# Altium footprint library Amirreza.PcbLib: 524 footprints (part 18 of 33)
Each footprint in its own frame and in the unit in brackets; x right, y up, seen from the top. Pads: shape width x height; smd on the part's side, far side on the other; paste and mask are expansions set on the pad; w line width, h text height; cw(c..) or ccw(c..) is an arc to the next point about the centre after c.
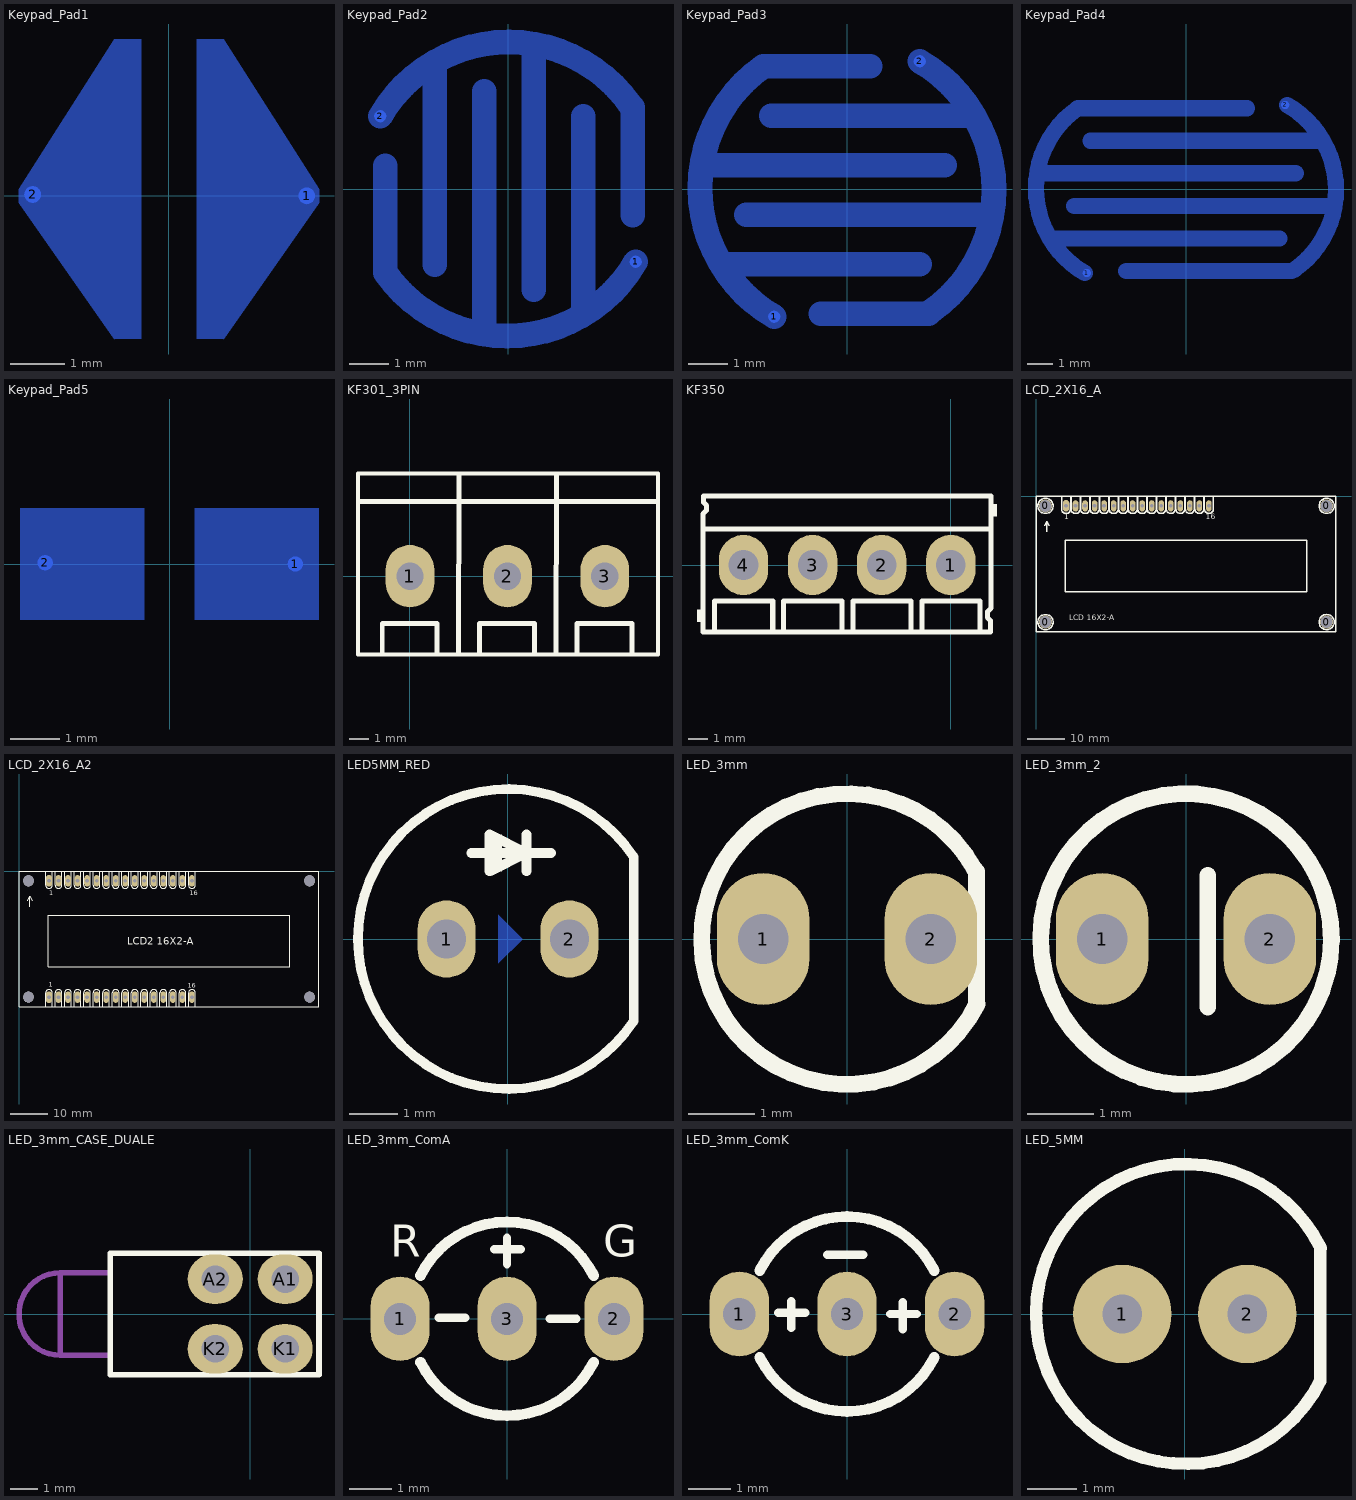
[diagram p17: the footprints below, top view; thin cyan lines are the x and y axes]

## Keypad_Pad1 [mm]
pads (2):
  round 0.3 smd far side: 1(2.525,0) 2(-2.5,0.025)
Bottom Layer:
  rectangle: -1,-2.625 -0.5,2.875
  rectangle: 0.5,-2.625 1,2.875
  region: 1,2.875 2.75,0.125 2.75,-0.125 1,-2.625
  region: -1,2.875 -2.75,0.125 -2.75,-0.125 -1,-2.625
Bottom Solder:
  rectangle: 0.5,-2.625 1,2.875
  rectangle: -1,-2.625 -0.5,2.875
  region: 1,2.875 2.75,0.125 2.75,-0.125 1,-2.625
  region: -1,2.875 -2.75,0.125 -2.75,-0.125 -1,-2.625

## Keypad_Pad2 [mm]
pads (2):
  round 0.3 smd far side: 1(3.263,-1.867) 2(-3.289,1.867)
Bottom Layer:
  lines w0.254: -0.739,-3.773 -0.624,-3.721 -0.739,-3.773
  lines w0.635: -3.289,1.867 cw(c0.011,-0.038) 3.132,2.148 ; -3.164,-2.146 -3.164,0.597 ; -3.157,-2.148 ccw(c-0.036,0.038) 3.263,-1.867 ; -1.894,-1.943 -1.894,3.137 ; -0.624,-3.721 -0.624,2.502 ; 0.646,-2.578 0.646,3.645 ; 1.916,-3.213 1.916,1.867 ; 3.186,-0.673 3.186,2.092
Bottom Solder:
  lines w0.635: -3.289,1.867 cw(c0.011,-0.038) 3.132,2.148 ; -3.164,-2.146 -3.164,0.597 ; -3.157,-2.148 ccw(c-0.036,0.038) 3.263,-1.867 ; -1.894,-1.943 -1.894,3.137 ; -0.624,-3.721 -0.624,2.502 ; 0.646,-2.578 0.646,3.645 ; 1.916,-3.213 1.916,1.867 ; 3.186,-0.673 3.186,2.092

## Keypad_Pad3 [mm]
pads (2):
  round 0.3 smd far side: 1(-1.867,-3.263) 2(1.867,3.289)
Bottom Layer:
  lines w0.254: -3.773,0.739 -3.721,0.624 -3.773,0.739
  lines w0.635: -3.721,0.624 2.502,0.624 ; -3.213,-1.916 1.867,-1.916 ; -2.578,-0.646 3.645,-0.646 ; -2.148,3.157 ccw(c0.038,0.036) -1.867,-3.263 ; -2.146,3.164 0.597,3.164 ; -1.943,1.894 3.137,1.894 ; -0.673,-3.186 2.092,-3.186 ; 1.867,3.289 cw(c-0.038,-0.011) 2.148,-3.132
Bottom Solder:
  lines w0.635: -3.721,0.624 2.502,0.624 ; -3.213,-1.916 1.867,-1.916 ; -2.578,-0.646 3.645,-0.646 ; -2.148,3.157 ccw(c0.038,0.036) -1.867,-3.263 ; -2.146,3.164 0.597,3.164 ; -1.943,1.894 3.137,1.894 ; -0.673,-3.186 2.092,-3.186 ; 1.867,3.289 cw(c-0.038,-0.011) 2.148,-3.132

## Keypad_Pad4 [mm]
pads (2):
  round 0.3 smd far side: 1(-3.867,-3.263) 2(3.867,3.289)
Bottom Layer:
  lines w0.635: -5.634,0.624 4.28,0.624 ; -5.118,-1.916 3.645,-1.916 ; -4.356,-0.646 5.55,-0.646 ; -4.223,3.157 ccw(c-2.038,0.036) -3.943,-3.263 ; -4.178,3.164 2.375,3.164 ; -3.721,1.894 5.169,1.894 ; -2.33,-3.186 4.124,-3.186 ; 3.943,3.289 cw(c2.038,-0.011) 4.223,-3.132
Bottom Solder:
  lines w0.635: -5.753,0.624 4.28,0.624 ; -5.245,-1.916 3.645,-1.916 ; -4.356,-0.646 5.677,-0.646 ; -4.223,3.157 ccw(c-2.038,0.036) -3.943,-3.263 ; -4.178,3.164 2.375,3.164 ; -3.721,1.894 5.296,1.894 ; -2.33,-3.186 4.124,-3.186 ; 3.943,3.289 cw(c2.038,-0.011) 4.223,-3.132

## Keypad_Pad5 [mm]
pads (2):
  round 0.3 smd far side: 1(2.525,0) 2(-2.5,0.025)
Bottom Layer:
  rectangle: 0.5,-1.125 3,1.125
  rectangle: -3,-1.125 -0.5,1.125
Bottom Solder:
  rectangle: -3.025,-1.15 -0.5,1.15
  rectangle: 0.5,-1.175 3,1.175

## KF301_3PIN [mm] "Connector; Header; 4 Position"
pads (3):
  oval 2.5x3.2 hole 1.4: 1(0,0) 2(5,0) 3(10,0)
Top Overlay:
  lines w0.2: -2.667,-4.013 12.725,-4.013 12.725,5.258 -2.667,5.258 -2.667,-4.013
  lines w0.254: -2.591,3.835 12.675,3.835 ; -1.422,-3.962 -1.422,-2.438 1.397,-2.438 1.397,-3.962 ; 2.489,-3.962 2.514,5.207 ; 3.578,-3.988 3.578,-2.438 6.397,-2.438 6.397,-3.962 ; 7.489,-3.962 7.514,5.131 ; 8.578,-3.988 8.578,-2.438 11.397,-2.438 11.397,-3.962

## KF350 [mm]
pads (4):
  oval 2.5x3.048 hole 1.5: 1(0,0) 2(-3.5,0) 3(-7,0) 4(-10.5,0)
Top Overlay:
  rectangle: 2.057,2.464 2.337,3.099
  rectangle: -12.852,-2.896 -12.573,-2.261
  lines w0.254: -12.522,1.829 2.007,1.829 ; -11.963,-3.404 -11.963,-1.829 -9.017,-1.829 -9.017,-3.378 ; -8.463,-3.404 -8.463,-1.829 -5.517,-1.829 -5.517,-3.378 ; -4.963,-3.404 -4.963,-1.829 -2.017,-1.829 -2.017,-3.378 ; -1.463,-3.404 -1.463,-1.829 1.483,-1.829 1.483,-3.404 ; -12.548,-3.404 -12.548,2.591 -12.37,2.769 -12.37,3.023 -12.522,3.175 -12.522,3.505 2.032,3.505 2.032,-2.184 1.854,-2.362 1.854,-2.667 2.007,-2.819 2.007,-3.404 -12.548,-3.404

## LCD_2X16_A [mm]
pads (20):
  round 3.5 hole 3.2: 0(2.54,-33.487) 0(2.54,-2.499) 0(77.47,-33.487) 0(77.47,-2.499)
  oct 1.5x3 hole 1: 1(8,-2.5)
  oval 1.5x3 hole 1: 2(10.54,-2.5) 3(13.08,-2.5) 4(15.62,-2.5) 5(18.16,-2.5) 6(20.7,-2.5) 7(23.24,-2.5) 8(25.78,-2.5) 9(28.32,-2.5) 10(30.86,-2.5) 11(33.4,-2.5) 12(35.94,-2.5) 13(38.48,-2.5) 14(41.02,-2.5) 15(43.56,-2.5) 16(46.1,-2.5)
Top Overlay:
  circle w0.381: c77.51,-2.499 r2.032
  circle w0.381: c77.51,-33.487 r2.032
  circle w0.381: c2.54,-33.5 r2.032
  circle w0.381: c2.54,-2.499 r2.032
  circle w0.127: c77.5,-2.499 r1.25
  circle w0.127: c2.5,-2.499 r1.25
  circle w0.127: c77.5,-33.5 r1.25
  circle w0.127: c2.5,-33.5 r1.25
  lines w0.381: 2.286,-7.833 2.921,-6.563 3.556,-7.833 ; 2.921,-9.375 2.921,-6.69 ; 6.806,-0.087 6.806,-3.353 ccw(c7.969,-3.353) 8.035,-4.514 ccw(c8.035,-3.351) 9.196,-3.285 ; 9.196,-3.279 9.203,0 ; 9.346,-0.087 9.346,-3.353 ccw(c10.509,-3.353) 10.575,-4.514 ccw(c10.575,-3.351) 11.736,-3.285 ; 11.736,-3.279 11.743,0 ; 11.886,-0.087 11.886,-3.353 ccw(c13.049,-3.353) 13.115,-4.514 ccw(c13.115,-3.351) 14.276,-3.285 ; 14.276,-3.279 14.283,0 ; 14.426,-0.087 14.426,-3.353 ccw(c15.589,-3.353) 15.655,-4.514 ccw(c15.655,-3.351) 16.816,-3.285 ; 16.816,-3.279 16.823,0 ; 16.966,-0.087 16.966,-3.353 ccw(c18.129,-3.353) 18.195,-4.514 ccw(c18.195,-3.351) 19.356,-3.285 ; 19.356,-3.279 19.363,0 ; 19.506,-0.087 19.506,-3.353 ccw(c20.669,-3.353) 20.735,-4.514 ccw(c20.735,-3.351) 21.896,-3.285 ; 21.896,-3.279 21.903,0 ; 22.046,-0.087 22.046,-3.353 ccw(c23.209,-3.353) 23.275,-4.514 ccw(c23.275,-3.351) 24.436,-3.285 ; 24.436,-3.279 24.443,0 ; 24.586,-0.087 24.586,-3.353 ccw(c25.749,-3.353) 25.815,-4.514 ccw(c25.815,-3.351) 26.976,-3.285 ; 26.976,-3.279 26.983,0 ; 27.126,-0.087 27.126,-3.353 ccw(c28.289,-3.353) 28.355,-4.514 ccw(c28.355,-3.351) 29.516,-3.285 ; 29.516,-3.279 29.523,0 ; 29.666,-0.087 29.666,-3.353 ccw(c30.829,-3.353) 30.895,-4.514 ccw(c30.895,-3.351) 32.056,-3.285 ; 32.056,-3.279 32.063,0 ; 32.206,-0.087 32.206,-3.353 ccw(c33.369,-3.353) 33.435,-4.514 ccw(c33.435,-3.351) 34.596,-3.285 ; 34.596,-3.279 34.603,0 ; 34.746,-0.087 34.746,-3.353 ccw(c35.909,-3.353) 35.975,-4.514 ccw(c35.975,-3.351) 37.136,-3.285 ; 37.136,-3.279 37.143,0 ; 37.286,-0.087 37.286,-3.353 ccw(c38.449,-3.353) 38.515,-4.514 ccw(c38.515,-3.351) 39.676,-3.285 ; 39.676,-3.279 39.683,0 ; 39.826,-0.087 39.826,-3.353 ccw(c40.989,-3.353) 41.055,-4.514 ccw(c41.055,-3.351) 42.216,-3.285 ; 42.216,-3.279 42.223,0 ; 42.366,-0.087 42.366,-3.353 ccw(c43.529,-3.353) 43.595,-4.514 ccw(c43.595,-3.351) 44.756,-3.285 ; 44.756,-3.279 44.763,0 ; 44.906,-0.087 44.906,-3.353 ccw(c46.069,-3.353) 46.135,-4.514 ccw(c46.135,-3.351) 47.296,-3.285 ; 47.296,-3.279 47.303,0 ; 0,-36 0,0 80,0 80,-36 0,-36 ; 7.75,-25.4 72.25,-25.4 72.25,-11.6 7.75,-11.6 7.75,-25.4
  text "LCD 16X2-A" at 8.865,-33.599 h2.54
  text "1" at 7.544,-6.629 h2.54
  text "16" at 45.313,-6.64 h2.54
3D body "LCD2X16--3DModel-STEP-56544.STEP": height 14, standoff 4, extent 0.005,-36.059 80.005,-0.059
3D body "6-146285-6.stp": height 8.58, standoff -1.84, extent 6.934,-3.632 47.168,-1.295

## LCD_2X16_A2 [mm]
pads (36):
  oval 1.4x2 hole 3: 0(2.54,-2.499) 1(2.54,-33.487) 2(77.47,-2.499) 3(77.47,-33.487)
  oct 1.524x3.048 hole 1: 1(8,-33.5) 1(8,-2.5)
  oval 1.524x3.048 hole 1: 2(10.54,-33.5) 2(10.54,-2.5) 3(13.08,-33.5) 3(13.08,-2.5) 4(15.62,-33.5) 4(15.62,-2.5) 5(18.16,-33.5) 5(18.16,-2.5) 6(20.7,-33.5) 6(20.7,-2.5) 7(23.24,-33.5) 7(23.24,-2.5) 8(25.78,-33.5) 8(25.78,-2.5) 9(28.32,-33.5) 9(28.32,-2.5) 10(30.86,-33.5) 10(30.86,-2.5) 11(33.4,-33.5) 11(33.4,-2.5) 12(35.94,-33.5) 12(35.94,-2.5) 13(38.48,-33.5) 13(38.48,-2.5) 14(41.02,-33.5) 14(41.02,-2.5) 15(43.56,-33.5) 15(43.56,-2.5) 16(46.1,-33.5) 16(46.1,-2.5)
Top Overlay:
  circle w0.127: c2.5,-33.5 r1.25
  circle w0.127: c77.5,-33.5 r1.25
  circle w0.127: c2.5,-2.499 r1.25
  circle w0.127: c77.5,-2.499 r1.25
  lines w0.127: 2.286,-7.833 2.921,-6.563 3.556,-7.833 ; 2.921,-9.375 2.921,-6.69 ; 7.111,-35.913 7.111,-32.357 cw(c8,-32.357) 8.889,-32.357 8.889,-35.913 ; 7.111,-0.087 7.111,-3.643 ccw(c8,-3.643) 8.889,-3.643 8.889,-0.087 ; 9.651,-35.913 9.651,-32.357 cw(c10.54,-32.357) 11.429,-32.357 11.429,-35.913 ; 9.651,-0.087 9.651,-3.643 ccw(c10.54,-3.643) 11.429,-3.643 11.429,-0.087 ; 12.191,-35.913 12.191,-32.357 cw(c13.08,-32.357) 13.969,-32.357 13.969,-35.913 ; 12.191,-0.087 12.191,-3.643 ccw(c13.08,-3.643) 13.969,-3.643 13.969,-0.087 ; 14.731,-35.913 14.731,-32.357 cw(c15.62,-32.357) 16.509,-32.357 16.509,-35.913 ; 14.731,-0.087 14.731,-3.643 ccw(c15.62,-3.643) 16.509,-3.643 16.509,-0.087 ; 17.271,-35.913 17.271,-32.357 cw(c18.16,-32.357) 19.049,-32.357 19.049,-35.913 ; 17.271,-0.087 17.271,-3.643 ccw(c18.16,-3.643) 19.049,-3.643 19.049,-0.087 ; 19.811,-35.913 19.811,-32.357 cw(c20.7,-32.357) 21.589,-32.357 21.589,-35.913 ; 19.811,-0.087 19.811,-3.643 ccw(c20.7,-3.643) 21.589,-3.643 21.589,-0.087 ; 22.351,-35.913 22.351,-32.357 cw(c23.24,-32.357) 24.129,-32.357 24.129,-35.913 ; 22.351,-0.087 22.351,-3.643 ccw(c23.24,-3.643) 24.129,-3.643 24.129,-0.087 ; 24.891,-35.913 24.891,-32.357 cw(c25.78,-32.357) 26.669,-32.357 26.669,-35.913 ; 24.891,-0.087 24.891,-3.643 ccw(c25.78,-3.643) 26.669,-3.643 26.669,-0.087 ; 27.431,-35.913 27.431,-32.357 cw(c28.32,-32.357) 29.209,-32.357 29.209,-35.913 ; 27.431,-0.087 27.431,-3.643 ccw(c28.32,-3.643) 29.209,-3.643 29.209,-0.087 ; 29.971,-35.913 29.971,-32.357 cw(c30.86,-32.357) 31.749,-32.357 31.749,-35.913 ; 29.971,-0.087 29.971,-3.643 ccw(c30.86,-3.643) 31.749,-3.643 31.749,-0.087 ; 32.511,-35.913 32.511,-32.357 cw(c33.4,-32.357) 34.289,-32.357 34.289,-35.913 ; 32.511,-0.087 32.511,-3.643 ccw(c33.4,-3.643) 34.289,-3.643 34.289,-0.087 ; 35.051,-35.913 35.051,-32.357 cw(c35.94,-32.357) 36.829,-32.357 36.829,-35.913 ; 35.051,-0.087 35.051,-3.643 ccw(c35.94,-3.643) 36.829,-3.643 36.829,-0.087 ; 37.591,-35.913 37.591,-32.357 cw(c38.48,-32.357) 39.369,-32.357 39.369,-35.913 ; 37.591,-0.087 37.591,-3.643 ccw(c38.48,-3.643) 39.369,-3.643 39.369,-0.087 ; 40.131,-35.913 40.131,-32.357 cw(c41.02,-32.357) 41.909,-32.357 41.909,-35.913 ; 40.131,-0.087 40.131,-3.643 ccw(c41.02,-3.643) 41.909,-3.643 41.909,-0.087 ; 42.671,-35.913 42.671,-32.357 cw(c43.56,-32.357) 44.449,-32.357 44.449,-35.913 ; 42.671,-0.087 42.671,-3.643 ccw(c43.56,-3.643) 44.449,-3.643 44.449,-0.087 ; 45.211,-35.913 45.211,-32.357 cw(c46.1,-32.357) 46.989,-32.357 46.989,-35.913 ; 45.211,-0.087 45.211,-3.643 ccw(c46.1,-3.643) 46.989,-3.643 46.989,-0.087 ; 0,-36 80,-36 80,0 0,0 0,-36 ; 7.75,-25.4 7.75,-11.6 72.25,-11.6 72.25,-25.4 7.75,-25.4
  text "1" at 7.961,-30.75 h1.27
  text "16" at 45.061,-31.05 h1.27
  text "16" at 45.592,-6.31 h1.27
  text "1" at 8,-6.31 h1.27
  text "LCD2 16X2-A" at 28.91,-19.499 h1.91

## LED5MM_RED [mm] "LED THD 5MM RED"
pads (2):
  oval 1.2x1.6 hole 0.8: 1(-1.27,0) 2(1.27,0)
Bottom Layer:
  region: -0.2,0.5 -0.2,-0.5 0.3,0
Top Overlay:
  rectangle: -0.381,1.397 -0.127,2.159
  lines w0.2: -0.762,1.778 0.889,1.778 ; 0.381,1.397 0.381,2.159 ; 2.6,-1.7 2.6,1.7 ; 2.6,-1.688 cw(c0,0) 2.6,1.688 ; -0.381,1.397 0.381,1.778 -0.381,2.159 -0.381,1.397
3D body "LED-D5R.step": height 9.14, standoff -6.3, extent -3,-3 2.5,3

## LED_3mm [mm]
pads (2):
  oval 1.4x2 hole 0.762: 1(-1.27,0) 2(1.27,0)
Top Overlay:
  lines w0.254: 1.929,1.057 ccw(c0,0) 1.968,-0.984 ; 1.961,-0.967 1.961,1.026
3D body "everlight-3MM-LED-RED.step": height 8.64, standoff -3.93, extent -1.9,-1.9 1.526,1.9

## LED_3mm_2 [mm]
pads (2):
  oval 1.4x2 hole 0.762: 1(-1.27,0) 2(1.27,0)
Top Overlay:
  lines w0.254: 0.33,-1.028 0.33,0.965 ; 1.942,-1.033 cw(c0,0) 1.957,-1.004

## LED_3mm_CASE_DUALE [mm]
pads (4):
  oval 2x1.8 hole 1: A1(1.27,1.27) A2(-1.27,1.27) K1(1.27,-1.27) K2(-1.27,-1.27)
Top Overlay:
  lines w0.2: -5.082,-2.2 2.5,-2.2 2.5,2.2 -5.082,2.2 -5.082,-2.2
Mechanical 2:
  lines w0.2: -5.082,-1.5 -6.9,-1.5 ; -5.082,1.5 -6.9,1.5 ; -6.9,-1.5 cw(c-6.9,0) -6.9,1.5 ; -6.9,-1.5 -6.9,1.5
3D body "LED3MMRX2.step": height 9.65, standoff -3.68, extent -8.55,-2.168 2.448,2.15

## LED_3mm_ComA [mm]
pads (3):
  oval 1.4x2 hole 0.762: 1(-2.54,0) 2(2.54,0) 3(0,0)
Top Overlay:
  lines w0.2: -1.626,0.025 -0.991,0.025 ; -0.305,1.651 0.33,1.651 ; 0,1.295 0,1.93 ; 1.016,0 1.651,0
  lines w0.254: -2.057,-1.029 ccw(c0,0) 2.057,-1.029 ; -2.057,1.029 cw(c0,0) 2.057,1.029
  text "G" at 2.286,1.229 h1.3
  text "R" at -2.769,1.223 h1.3
3D body "User Library-3mmLED_Thruhole v5.step": height 6.81, standoff -3.23, extent -2.786,-2.025 2.794,2.025

## LED_3mm_ComK [mm]
pads (3):
  oval 1.4x2 hole 0.762: 1(-2.54,0) 2(2.54,0) 3(0,0)
Top Overlay:
  lines w0.2: -1.626,0.025 -0.991,0.025 ; -1.321,-0.33 -1.321,0.305 ; -0.47,1.397 0.381,1.397 ; 1.016,0 1.651,0 ; 1.321,-0.356 1.321,0.279
  lines w0.254: -2.057,-1.029 ccw(c0,0) 2.057,-1.029 ; -2.057,1.029 cw(c0,0) 2.057,1.029
3D body "User Library-3mmLED_Thruhole v5.step": height 6.81, standoff -3.23, extent -2.786,-2.025 2.794,2.025

## LED_5MM [mm]
pads (2):
  round 2 hole 0.8: 1(-1.27,0) 2(1.27,0)
Top Overlay:
  lines w0.254: 2.75,1.329 2.75,-1.363 cw(c0.024,0) 2.765,1.334
3D body "led orjinal.SLDPRT": height 15.6, standoff -16, extent -2.925,-2.925 2.788,2.925